# Altium schematic symbol library IC_ADI.SCHLIB: 3169 symbols (part 50 of 181) (continued)
## AD7396ARZ (continued)
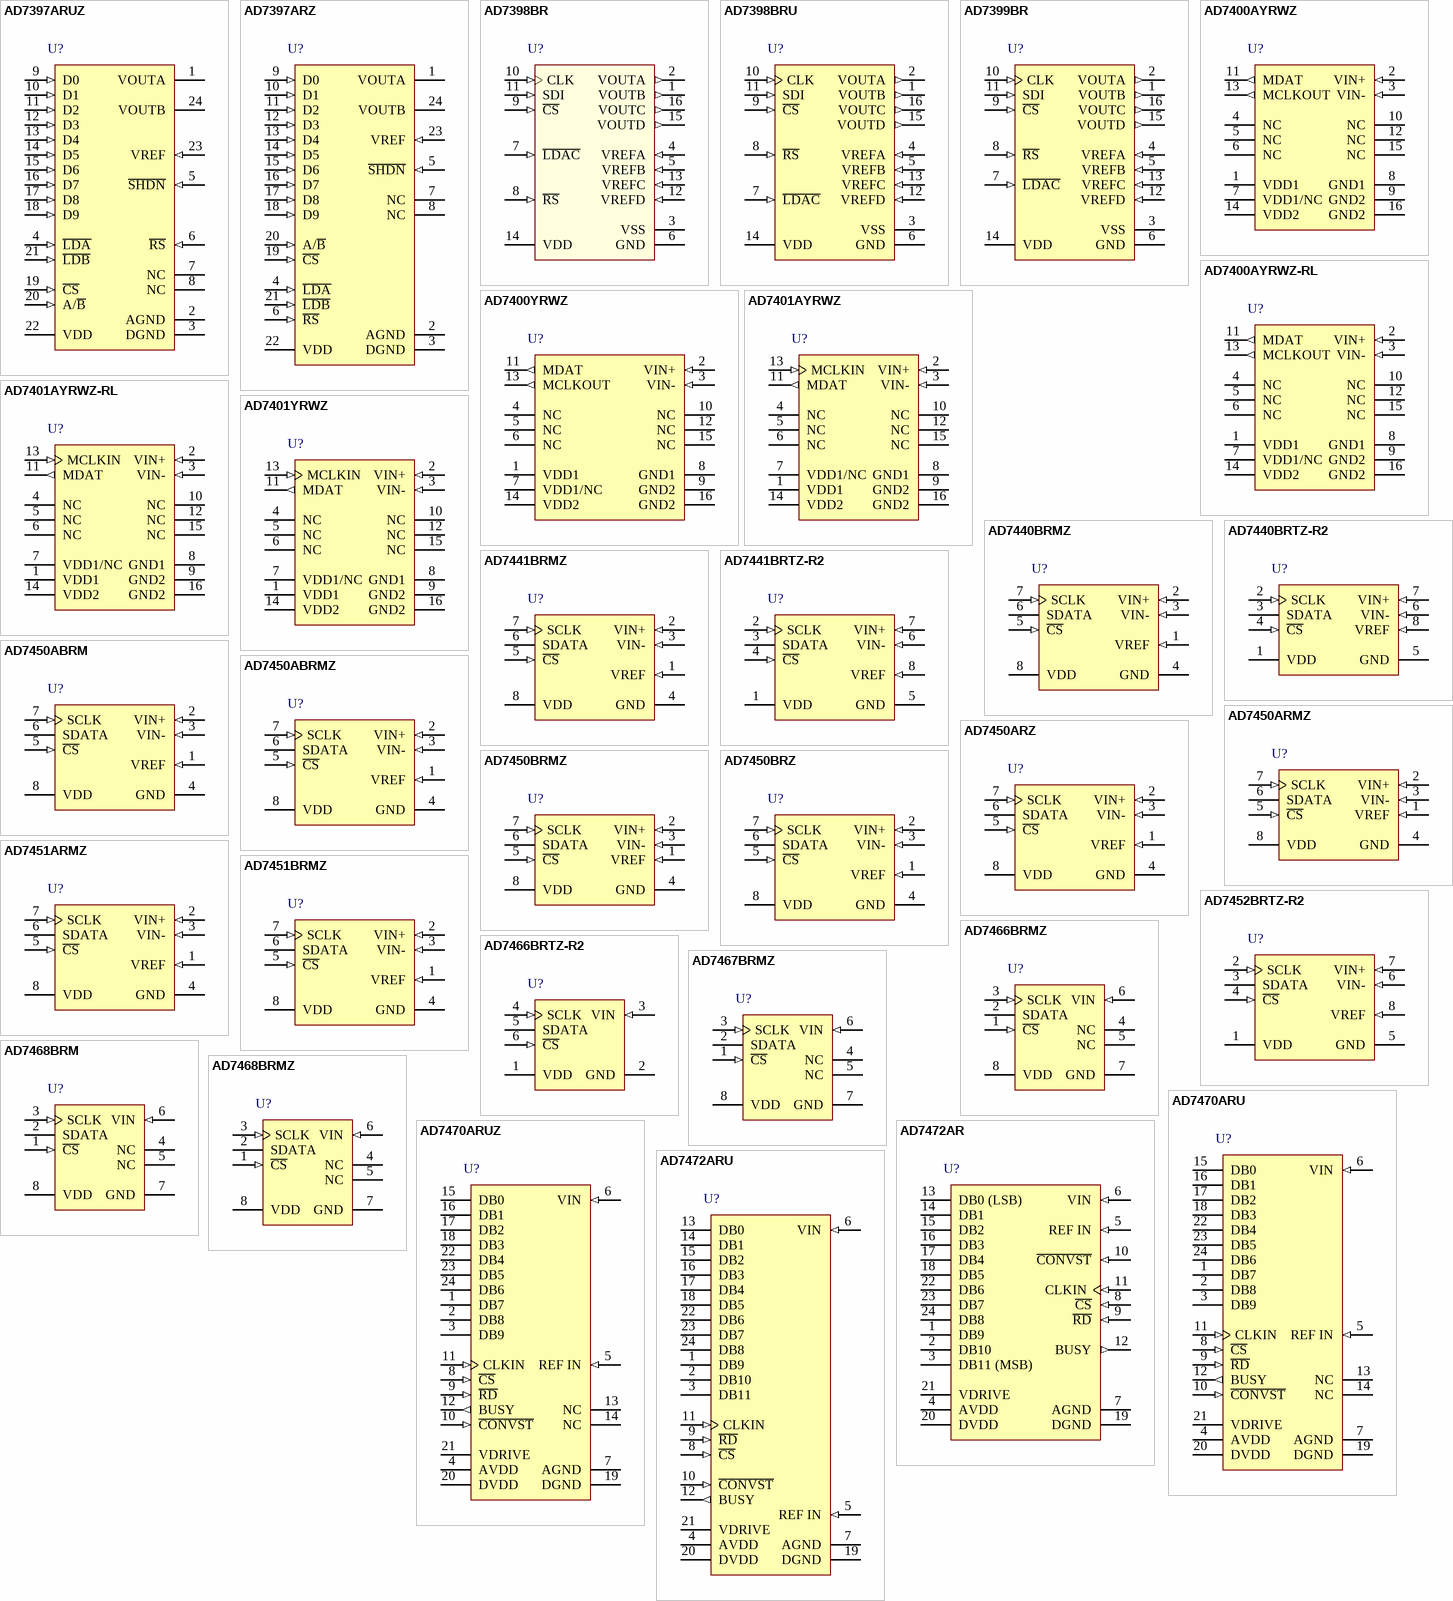
[diagram p43: symbols AD7397ARUZ to AD7472ARU]

## AD7397ARUZ
designator U?
Dual 10-Bit Digital-to-Analog Converter with Parallel Interface, 3 V, -40 to +85 degC, RU-24, Pb-Free, Tube; Generic Part Number: AD7397; PartNumber: AD7397ARUZ; # DAC Outputs: 2; Max V+: 5.5V; Op Pwr Diss: 1mW; Resolution (Bits): 10; Settling Time: 60祍; Single Supply: Yes; DatasheetVersion: Rev.0; PackageVersion: 2002; PackageReference: RU-24; PackageDescription: 24-Lead Thin Shrink Small Outline Package [TSSOP]; Supplier Part Number 1: AD7397ARUZ-ND; Supplier Part Number 2: 584-AD7397ARUZ; Packing: Tube; RoHS: Y; Mounting Technology: Surface Mount; Code_JEDEC: MO-153-AD; ComponentLink1Description: Manufacturer URL; ComponentLink2Description: Datasheet; ComponentLink3Description: Package Specification; ComponentLink4Description: Product URL
footprint TSSOP24_0.65 (Footprint not found)
pins: 1 VOUTA (hiz) "DAC A Voltage Output.", 2 AGND (power) "Analog Ground.", 3 DGND (power) "Digital Ground.", 4 ~{LDA} (in) "Load DAC A Register Strobe. Transfers input register data to the DAC A register. Active low inputs, Level sensitive latch. May be connected together with L\D\B\ to double-buffer load both DAC registers simultaneously.", 5 ~{SHDN} (in) "Power Shutdown Active Low Input. DAC register contents are saved as long as power stays on the VDD pin.", 6 ~{RS} (in) "Resets Input and DAC Register to Zero Condition. Asynchronous active low input.", 7 NC "No Connect", 8 NC "No Connect", 9 D0 (in) "Ten Parallel Input Data Bits.D0 = LSB", 10 D1 (in) "Ten Parallel Input Data Bits.", 11 D2 (in) "Ten Parallel Input Data Bits.", 12 D3 (in) "Ten Parallel Input Data Bits.", 13 D4 (in) "Ten Parallel Input Data Bits.", 14 D5 (in) "Ten Parallel Input Data Bits.", 15 D6 (in) "Ten Parallel Input Data Bits.", 16 D7 (in) "Ten Parallel Input Data Bits.", 17 D8 (in) "Ten Parallel Input Data Bits.", 18 D9 (in) "Ten Parallel Input Data Bits.D9 = MSB", 19 ~{CS} (in) "Chip Select Latch Enable, Active Low.", 20 A/~{B} (in) "DAC Input Register Address Select DACA = 1 or DACB = 0.", 21 ~{LDB} (in) "Load DAC B Register Strobe. Transfers input register data to the DAC B register. Active low inputs, Level sensitive latch. May be connected together with L\D\A\ to double-buffer load both DAC registers simultaneously.", 22 VDD (power) "Positive Power Supply Input. Specified range of operation +2.7 V to +5.5 V.", 23 VREF (in) "DAC Reference Input Pin. Establishes DAC full-scale voltage.", 24 VOUTB (hiz) "DAC B Voltage Output."

## AD7397ARZ
designator U?
Dual 10-Bit Digital-to-Analog Converter with Parallel Interface, 3 V, -40 to +125 degC, RW-24, Pb-Free, Tube; Generic Part Number: AD7397; PartNumber: AD7397ARZ; # DAC Outputs: 2; Max V+: 5.5V; Op Pwr Diss: 1mW; Resolution (Bits): 10; Settling Time: 60祍; Single Supply: Yes; DatasheetVersion: Rev.0; PackageVersion: 060706-A; PackageReference: RW-24; PackageDescription: 24-Lead Standard Small Outline Package [SOIC_W]; Supplier Part Number 1: AD7397ARZ-ND; Supplier Part Number 2: 59K4773; Supplier Part Number 3: 584-AD7397ARZ; Packing: Tube; RoHS: Y; Mounting Technology: Surface Mount; Code_JEDEC: MS-013-AD; ComponentLink1Description: Manufacturer URL; ComponentLink2Description: Datasheet; ComponentLink3Description: Package Specification; ComponentLink4Description: Product URL
footprint SOIC24W_1.27 (Footprint not found)
pins: 1 VOUTA (hiz) "DAC A Voltage Output.", 2 AGND (power) "Analog Ground.", 3 DGND (power) "Digital Ground.", 4 ~{LDA} (in) "Load DAC A Register Strobe. Transfers input register data to the DAC A register. Active low inputs, Level sensitive latch. May be connected together with L\D\B\ to double-buffer load both DAC registers simultaneously.", 5 ~{SHDN} (in) "Power Shutdown Active Low Input. DAC register contents are saved as long as power stays on the VDD pin.", 6 ~{RS} (in) "Resets Input and DAC Register to Zero Condition. Asynchronous active low input.", 7 NC "No Connect", 8 NC "No Connect", 9 D0 (in) "Parallel Input Data Bit,D0 = LSB Pin 9", 10 D1 (in) "Parallel Input Data Bit", 11 D2 (in) "Parallel Input Data Bit", 12 D3 (in) "Parallel Input Data Bit", 13 D4 (in) "Parallel Input Data Bit", 14 D5 (in) "Parallel Input Data Bit", 15 D6 (in) "Parallel Input Data Bit", 16 D7 (in) "Parallel Input Data Bit", 17 D8 (in) "Parallel Input Data Bit", 18 D9 (in) "Parallel Input Data Bit,D9 = MSB Pin 18", 19 ~{CS} (in) "Chip Select Latch Enable, Active Low.", 20 A/~{B} (in) "DAC Input Register Address Select DACA = 1 or DACB = 0.", 21 ~{LDB} (in) "Load DAC B Register Strobe. Transfers input register data to the DAC B register. Active low inputs, Level sensitive latch. May be connected together with L\D\A\ to double-buffer load both DAC registers simultaneously.", 22 VDD (power) "Positive Power Supply Input. Specified range of operation +2.7 V to +5.5 V.", 23 VREF (in) "DAC Reference Input Pin. Establishes DAC full-scale voltage.", 24 VOUTB (hiz) "DAC B Voltage Output."

## AD7398BR
designator U?
Quad 12-Bit Digital-to-Analog Converter with Serial Interface, -40 to +125 degC, RW-16, Tube; Generic Part Number: AD7398; PartNumber: AD7398BR; # DAC Outputs: 4; Max V+: 5.5V; Op Pwr Diss: 27mW; Resolution (Bits): 12; Settling Time: 6祍; Single Supply: Yes; DatasheetVersion: Rev.C; PackageVersion: 032707-B; PackageReference: RW-16; PackageDescription: 16-Lead Standard Small Outline Package [SOIC_W]; Supplier Part Number 1: AD7398BR-ND; Supplier Part Number 2: 584-AD7398BR; Packing: Tube; RoHS: N; Mounting Technology: Surface Mount; Code_JEDEC: MS-013-AA; Code_IPC: SOIC127P1030-16; ComponentLink1Description: Manufacturer URL; ComponentLink2Description: Datasheet; ComponentLink3Description: Package Specification; ComponentLink4Description: Product URL
footprint SOIC16W_1.27 (Footprint not found)
pins: 1 VOUTB (out) "DAC B Voltage Output.", 2 VOUTA (out) "DAC A Voltage Output.", 3 VSS (power) "Negative Power Supply Input. Specified range of operation 0 V to -5.5 V.", 4 VREFA (in) "DAC A Reference Voltage Input Terminal. Establishes DAC A full-scale output voltage. Pin can be tied to VDD pin or VSS pin.", 5 VREFB (in) "DAC B Reference Voltage Input Terminal. Establishes DAC B full-scale output voltage. Pin can be tied to VDD pin or VSS pin.", 6 GND (power) "Ground Pin.", 7 ~{LDAC} (in) "Load DAC Register Strobe. Level sensitive active low. Transfers all input register data to DAC registers.Asynchronous active low input. See Table 5 for operation.", 8 ~{RS} (in) "Resets Input and DAC Registers to All Zero Codes. Shift register contents unchanged.", 9 ~{CS} (in) "Chip Select. Active low input. Disables shift register loading when high. Transfers serial register data to the input register when C\S\ returns high. Does not effect L\D\A\C\ operation.", 10 CLK (in) "Schmitt Triggered Clock Input. Positive edge clocks data into shift register.", 11 SDI (in) "Serial Data Input. Input data loads directly into the shift register.", 12 VREFD (in) "DAC D Reference Voltage Input Terminal. Establishes DAC D full-scale output voltage. Pin can be tied to VDD pin or VSS pin.", 13 VREFC (in) "DAC C Reference Voltage Input Terminal. Establishes DAC C full-scale output voltage. Pin can be tied to VDD pin or VSS pin.", 14 VDD (power) "Positive Power Supply Input. Specified range of operation 3 V to 5 V +/- 10%.", 15 VOUTD (out) "DAC D Voltage Output.", 16 VOUTC (out) "DAC C Voltage Output."

## AD7398BRU
designator U?
Quad 12-Bit Digital-to-Analog Converter with Serial Interface, -40 to +125 degC, RU-16, Tube; Generic Part Number: AD7398; PartNumber: AD7398BRU; # DAC Outputs: 4; Max V+: 5.5V; Op Pwr Diss: 27mW; Resolution (Bits): 12; Settling Time: 6祍; Single Supply: Yes; DatasheetVersion: Rev.C; PackageVersion: Nov-2002; PackageReference: RU-16; PackageDescription: 16-Lead Thin Shrink Small Outline Package [TSSOP]; Supplier Part Number 1: AD7398BRU-ND; Supplier Part Number 2: 584-AD7398BRU; Packing: Tube; RoHS: N; Mounting Technology: Surface Mount; Code_JEDEC: MO-153-AB; ComponentLink1Description: Manufacturer URL; ComponentLink2Description: Datasheet; ComponentLink3Description: Package Specification; ComponentLink4Description: Product URL
footprint TSSOP16_0.65 (Footprint not found)
pins: 1 VOUTB (out) "DAC B Voltage Output.", 2 VOUTA (out) "DAC A Voltage Output.", 3 VSS (power) "Negative Power Supply Input. Specified range of operation 0 V to -5.5 V.", 4 VREFA (in) "DAC A Reference Voltage Input Terminal. Establishes DAC A full-scale output voltage. Pin can be tied to VDD pin or VSS pin.", 5 VREFB (in) "DAC B Reference Voltage Input Terminal. Establishes DAC B full-scale output voltage. Pin can be tied to VDD pin or VSS pin.", 6 GND (power) "Ground Pin.", 7 ~{LDAC} (in) "Load DAC Register Strobe. Level sensitive active low. Transfers all input register data to DAC registers.Asynchronous active low input. See Table 5 for operation.", 8 ~{RS} (in) "Resets Input and DAC Registers to All Zero Codes. Shift register contents unchanged.", 9 ~{CS} (in) "Chip Select. Active low input. Disables shift register loading when high. Transfers serial register data to the input register when C\S\ returns high. Does not effect L\D\A\C\ operation.", 10 CLK (in) "Schmitt Triggered Clock Input. Positive edge clocks data into shift register.", 11 SDI (in) "Serial Data Input. Input data loads directly into the shift register.", 12 VREFD (in) "DAC D Reference Voltage Input Terminal. Establishes DAC D full-scale output voltage. Pin can be tied to VDD pin or VSS pin.", 13 VREFC (in) "DAC C Reference Voltage Input Terminal. Establishes DAC C full-scale output voltage. Pin can be tied to VDD pin or VSS pin.", 14 VDD (power) "Positive Power Supply Input. Specified range of operation 3 V to 5 V +/- 10%.", 15 VOUTD (out) "DAC D Voltage Output.", 16 VOUTC (out) "DAC C Voltage Output."

## AD7399BR
designator U?
Quad 10-Bit Digital-to-Analog Converter with Serial Interface, -40 to +125 degC, RW-16, Tube; Generic Part Number: AD7399; PartNumber: AD7399BR; # DAC Outputs: 4; Max V+: 5.5V; Op Pwr Diss: 27mW; Resolution (Bits): 10; Settling Time: 6祍; Single Supply: Yes; DatasheetVersion: Rev.C; PackageVersion: 032707-B; PackageReference: RW-16; PackageDescription: 16-Lead Standard Small Outline Package [SOIC_W]; Supplier Part Number 1: AD7399BR-ND; Supplier Part Number 2: 584-AD7399BR; Packing: Tube; RoHS: N; Mounting Technology: Surface Mount; Code_JEDEC: MS-013-AA; Code_IPC: SOIC127P1030-16; ComponentLink1Description: Manufacturer URL; ComponentLink2Description: Datasheet; ComponentLink3Description: Package Specification; ComponentLink4Description: Product URL
footprint SOIC16W_1.27 (Footprint not found)
pins: 1 VOUTB (out) "DAC B Voltage Output.", 2 VOUTA (out) "DAC A Voltage Output.", 3 VSS (power) "Negative Power Supply Input. Specified range of operation 0 V to -5.5 V.", 4 VREFA (in) "DAC A Reference Voltage Input Terminal. Establishes DAC A full-scale output voltage. Pin can be tied to VDD pin or VSS pin.", 5 VREFB (in) "DAC B Reference Voltage Input Terminal. Establishes DAC B full-scale output voltage. Pin can be tied to VDD pin or VSS pin.", 6 GND (power) "Ground Pin.", 7 ~{LDAC} (in) "Load DAC Register Strobe. Level sensitive active low. Transfers all input register data to DAC registers.Asynchronous active low input. See Table 5 for operation.", 8 ~{RS} (in) "Resets Input and DAC Registers to All Zero Codes. Shift register contents unchanged.", 9 ~{CS} (in) "Chip Select. Active low input. Disables shift register loading when high. Transfers serial register data to the input register when C\S\ returns high. Does not effect L\D\A\C\ operation.", 10 CLK (in) "Schmitt Triggered Clock Input. Positive edge clocks data into shift register.", 11 SDI (in) "Serial Data Input. Input data loads directly into the shift register.", 12 VREFD (in) "DAC D Reference Voltage Input Terminal. Establishes DAC D full-scale output voltage. Pin can be tied to VDD pin or VSS pin.", 13 VREFC (in) "DAC C Reference Voltage Input Terminal. Establishes DAC C full-scale output voltage. Pin can be tied to VDD pin or VSS pin.", 14 VDD (power) "Positive Power Supply Input. Specified range of operation 3 V to 5 V +/- 10%.", 15 VOUTD (out) "DAC D Voltage Output.", 16 VOUTC (out) "DAC C Voltage Output."

## AD7400AYRWZ
designator U?
Isolated Sigma-Delta Modulator, 10MSPS, -40 to +125 degC, RW-16, Pb-Free, Tube; Generic Part Number: AD7400A; PartNumber: AD7400AYRWZ; Resolution (Bits): 16; Channels: 1; Throughput Rate (SPS): 10M; Interface: Ser; DatasheetVersion: Rev.C; PackageVersion: 032707-B; PackageReference: RW-16; PackageDescription: 16-Lead Standard Small Outline Package [SOIC_W]; Supplier Part Number 1: AD7400AYRWZ-ND; Supplier Part Number 2: 2077695; Supplier Part Number 3: 19P8286; Supplier Part Number 4: 584-AD7400AYRWZ; RoHS: Y; Packing: Tube; Mounting Technology: Surface Mount; Code_JEDEC: MS-013-AA; Code_IPC: SOIC127P1030-16; ComponentLink1Description: Manufacturer URL; ComponentLink2Description: Datasheet; ComponentLink3Description: Package Specification; ComponentLink4Description: Product URL
footprint SOIC16W_1.27 (Footprint not found)
pins: 1 VDD1 (power) "Supply Voltage, 4.5 V to 5.5 V. This is the supply voltage for the isolated side of the AD7400A and is relative to GND1.", 2 VIN+ (in) "Positive Analog Input. Specified range of +/-250 mV.", 3 VIN- (in) "Negative Analog Input. Normally connected to GND1.", 4 NC "No Connect.", 5 NC "No Connect.", 6 NC "No Connect.", 7 VDD1/NC (power) "Supply Voltage. 4.5 V to 5.5 V. This is the supply voltage for the isolated side of the AD7400A and is relative to GND1.No Connect (NC). If desired, Pin 7 of the SOIC device may be allowed to float. It should not be tied to (See Datasheet)", 8 GND1 (power) "Ground 1. This is the ground reference point for all circuitry on the isolated side.", 9 GND2 (power) "Ground 2. This is the ground reference point for all circuitry on the nonisolated side.", 10 NC "No Connect.", 11 MDAT (out) "Serial Data Output. The single bit modulator output is supplied to this pin as a serial data stream. The bits are clocked out on the rising edge of the MCLKOUT output and are valid on the following MCLKOUT rising edge.", 12 NC "No Connect.", 13 MCLKOUT (out) "Master Clock Logic Output (10 MHz Typical). The bit stream from the modulator is valid on the rising edge of MCLKOUT.", 14 VDD2 (power) "Supply Voltage, 3 V to 5.5 V. This is the supply voltage for the nonisolated side and is relative to GND2.", 15 NC "No Connect.", 16 GND2 (power) "Ground 2. This is the ground reference point for all circuitry on the nonisolated side."

## AD7400AYRWZ-RL
designator U?
Isolated Sigma-Delta Modulator, 10MSPS, -40 to +125 degC, RW-16, Pb-Free, Reel; Generic Part Number: AD7400A; PartNumber: AD7400AYRWZ-RL; Resolution (Bits): 16; Channels: 1; Throughput Rate (SPS): 10M; Interface: Ser; DatasheetVersion: Rev.C; PackageVersion: 032707-B; PackageReference: RW-16; PackageDescription: 16-Lead Standard Small Outline Package [SOIC_W]; Supplier Part Number 1: AD7400AYRWZ-RL-ND; Supplier Part Number 2: 584-AD7400AYRWZ-R; RoHS: Y; Packing: Reel; Mounting Technology: Surface Mount; Code_JEDEC: MS-013-AA; Code_IPC: SOIC127P1030-16; ComponentLink1Description: Manufacturer URL; ComponentLink2Description: Datasheet; ComponentLink3Description: Package Specification; ComponentLink4Description: Product URL
footprint SOIC16W_1.27 (Footprint not found)
pins: 1 VDD1 (power) "Supply Voltage, 4.5 V to 5.5 V. This is the supply voltage for the isolated side of the AD7400A and is relative to GND1.", 2 VIN+ (in) "Positive Analog Input. Specified range of +/-250 mV.", 3 VIN- (in) "Negative Analog Input. Normally connected to GND1.", 4 NC "No Connect.", 5 NC "No Connect.", 6 NC "No Connect.", 7 VDD1/NC (power) "Supply Voltage. 4.5 V to 5.5 V. This is the supply voltage for the isolated side of the AD7400A and is relative to GND1.No Connect (NC). If desired, Pin 7 of the SOIC device may be allowed to float. It should not be tied to (See Datasheet)", 8 GND1 (power) "Ground 1. This is the ground reference point for all circuitry on the isolated side.", 9 GND2 (power) "Ground 2. This is the ground reference point for all circuitry on the nonisolated side.", 10 NC "No Connect.", 11 MDAT (out) "Serial Data Output. The single bit modulator output is supplied to this pin as a serial data stream. The bits are clocked out on the rising edge of the MCLKOUT output and are valid on the following MCLKOUT rising edge.", 12 NC "No Connect.", 13 MCLKOUT (out) "Master Clock Logic Output (10 MHz Typical). The bit stream from the modulator is valid on the rising edge of MCLKOUT.", 14 VDD2 (power) "Supply Voltage, 3 V to 5.5 V. This is the supply voltage for the nonisolated side and is relative to GND2.", 15 NC "No Connect.", 16 GND2 (power) "Ground 2. This is the ground reference point for all circuitry on the nonisolated side."

## AD7400YRWZ
designator U?
Isolated Sigma-Delta Modulator, 10MSPS, -40 to +105 degC, RW-16, Pb-Free, Tube; Generic Part Number: AD7400; PartNumber: AD7400YRWZ; Resolution (Bits): 16; Channels: 1; Throughput Rate (SPS): 10M; Interface: Ser; DatasheetVersion: Rev.F; PackageVersion: 032707-B; PackageReference: RW-16; PackageDescription: 16-Lead Standard Small Outline Package [SOIC_W]; Supplier Part Number 1: AD7400YRWZ-ND; Supplier Part Number 2: 1274243; Supplier Part Number 3: 31M4250; Supplier Part Number 4: 19M0866; Supplier Part Number 5: 584-AD7400YRWZ; RoHS: Y; Packing: Tube; Mounting Technology: Surface Mount; Code_JEDEC: MS-013-AA; Code_IPC: SOIC127P1030-16; ComponentLink1Description: Manufacturer URL; ComponentLink2Description: Datasheet; ComponentLink3Description: Package Specification; ComponentLink4Description: Product URL
footprint SOIC16W_1.27 (Footprint not found)
pins: 1 VDD1 (power) "Supply Voltage. 4.5 V to 5.25 V. This is the supply voltage for the isolated side of the AD7400 and is relative to GND1.", 2 VIN+ (in) "Positive Analog Input. Specified range of +/-200 mV.", 3 VIN- (in) "Negative Analog Input. Normally connected to GND1.", 4 NC "No Connect.", 5 NC "No Connect.", 6 NC "No Connect.", 7 VDD1/NC (power) "Supply Voltage. 4.5 V to 5.25 V. This is the supply voltage for the isolated side of the AD7400 and is relative to GND1.", 8 GND1 (power) "Ground 1. This is the ground reference point for all circuitry on the isolated side.", 9 GND2 (power) "Ground 2. This is the ground reference point for all circuitry on the nonisolated side.", 10 NC "No Connect.", 11 MDAT (out) "Serial Data Output. The single bit modulator output is supplied to this pin as a serial data stream.  The bits are clocked out on the rising edge of the MCLKOUT output and valid on the following  MCLKOUT rising edge.", 12 NC "No Connect.", 13 MCLKOUT (out) "Master Clock Logic Output. 10 MHz typical. The bit stream from the modulator is valid on the rising edge  of MCLKOUT.", 14 VDD2 (power) "Supply Voltage. 3 V to 5.5 V. This is the supply voltage for the nonisolated side and is relative to GND2.", 15 NC "No Connect.", 16 GND2 (power) "Ground 2. This is the ground reference point for all circuitry on the nonisolated side."

## AD7401AYRWZ
designator U?
Isolated Sigma-Delta Modulator, 20MSPS, -40 to +125 degC, RW-16, Pb-Free, Tube; Generic Part Number: AD7401A; PartNumber: AD7401AYRWZ; Resolution (Bits): 16; Channels: 1; Throughput Rate (SPS): 20M; Interface: Ser; DatasheetVersion: Rev.C; PackageVersion: 032707-B; PackageReference: RW-16; PackageDescription: 16-Lead Standard Small Outline Package [SOIC_W]; Supplier Part Number 1: AD7401AYRWZ-ND; Supplier Part Number 2: 2074851; Supplier Part Number 3: 07P8950; Supplier Part Number 4: 584-AD7401AYRWZ; RoHS: Y; Packing: Tube; Mounting Technology: Surface Mount; Code_JEDEC: MS-013-AA; Code_IPC: SOIC127P1030-16; ComponentLink1Description: Manufacturer URL; ComponentLink2Description: Datasheet; ComponentLink3Description: Package Specification; ComponentLink4Description: Product URL
footprint SOIC16W_1.27 (Footprint not found)
pins: 1 VDD1 (power) "Supply Voltage, 4.5 V to 5.5 V. This is the supply voltage for the isolated side of the AD7401A and is relative to GND1.", 2 VIN+ (in) "Supply Voltage, 4.5 V to 5.5 V. This is the supply voltage for the isolated side of the AD7401A and is relative to GND1.", 3 VIN- (in) "Negative Analog Input. Normally connected to GND1.", 4 NC "No Connect.", 5 NC "No Connect.", 6 NC "No Connect.", 7 VDD1/NC (power) "Supply Voltage. 4.5 V to 5.5 V. This is the supply voltage for the isolated side of the AD7401A and is relative to GND1.No Connect (NC). If desired, Pin 7 may be allowed to float. It should not be tied to ground. The AD7401A (See Datasheet)", 8 GND1 "Ground 1. This is the ground reference point for all circuitry on the isolated side.", 9 GND2 "Ground 2. This is the ground reference point for all circuitry on the nonisolated side.", 10 NC "No Connect.", 11 MDAT (out) "Serial Data Output. The single bit modulator output is supplied to this pin as a serial data stream. The bits are clocked out on the rising edge of the MCLKIN input and valid on the following MCLKIN rising edge.", 12 NC "No Connect.", 13 MCLKIN (in) "Master Clock Logic Input. 20 MHz maximum. The bit stream from the modulator is valid on the rising edge of MCLKIN.", 14 VDD2 (power) "Supply Voltage. 3 V to 5.5 V. This is the supply voltage for the nonisolated side and is relative to GND2.", 15 NC "No Connect.", 16 GND2 "Ground 2. This is the ground reference point for all circuitry on the nonisolated side."

## AD7401AYRWZ-RL
designator U?
Isolated Sigma-Delta Modulator, 20MSPS, -40 to +125 degC, RW-16, Pb-Free, Reel; Generic Part Number: AD7401A; PartNumber: AD7401AYRWZ-RL; Resolution (Bits): 16; Channels: 1; Throughput Rate (SPS): 20M; Interface: Ser; DatasheetVersion: Rev.C; PackageVersion: 032707-B; PackageReference: RW-16; PackageDescription: 16-Lead Standard Small Outline Package [SOIC_W]; Supplier Part Number 1: AD7401AYRWZ-RLTR-ND; Supplier Part Number 2: AD7401AYRWZ-RLCT-ND; Supplier Part Number 3: AD7401AYRWZ-RLDKR-ND; Supplier Part Number 4: 584-AD7401AYRWZ-R; RoHS: Y; Packing: Reel; Mounting Technology: Surface Mount; Code_JEDEC: MS-013-AA; Code_IPC: SOIC127P1030-16; ComponentLink1Description: Manufacturer URL; ComponentLink2Description: Datasheet; ComponentLink3Description: Package Specification; ComponentLink4Description: Product URL
footprint SOIC16W_1.27 (Footprint not found)
pins: 1 VDD1 (power) "Supply Voltage, 4.5 V to 5.5 V. This is the supply voltage for the isolated side of the AD7401A and is relative to GND1.", 2 VIN+ (in) "Supply Voltage, 4.5 V to 5.5 V. This is the supply voltage for the isolated side of the AD7401A and is relative to GND1.", 3 VIN- (in) "Negative Analog Input. Normally connected to GND1.", 4 NC "No Connect.", 5 NC "No Connect.", 6 NC "No Connect.", 7 VDD1/NC (power) "Supply Voltage. 4.5 V to 5.5 V. This is the supply voltage for the isolated side of the AD7401A and is relative to GND1.No Connect (NC). If desired, Pin 7 may be allowed to float. It should not be tied to ground. The AD7401A (See Datasheet)", 8 GND1 "Ground 1. This is the ground reference point for all circuitry on the isolated side.", 9 GND2 "Ground 2. This is the ground reference point for all circuitry on the nonisolated side.", 10 NC "No Connect.", 11 MDAT (out) "Serial Data Output. The single bit modulator output is supplied to this pin as a serial data stream. The bits are clocked out on the rising edge of the MCLKIN input and valid on the following MCLKIN rising edge.", 12 NC "No Connect.", 13 MCLKIN (in) "Master Clock Logic Input. 20 MHz maximum. The bit stream from the modulator is valid on the rising edge of MCLKIN.", 14 VDD2 (power) "Supply Voltage. 3 V to 5.5 V. This is the supply voltage for the nonisolated side and is relative to GND2.", 15 NC "No Connect.", 16 GND2 "Ground 2. This is the ground reference point for all circuitry on the nonisolated side."

## AD7401YRWZ
designator U?
Isolated Sigma-Delta Modulator, 20MSPS, -40 to +105 degC, RW-16, Pb-Free, Tube; Generic Part Number: AD7401; PartNumber: AD7401YRWZ; Resolution (Bits): 16; Channels: 1; Throughput Rate (SPS): 20M; Interface: Ser; DatasheetVersion: Rev.D; PackageVersion: 032707-B; PackageReference: RW-16; PackageDescription: 16-Lead Standard Small Outline Package [SOIC_W]; Supplier Part Number 1: AD7401YRWZ-ND; Supplier Part Number 2: 1274242; Supplier Part Number 3: 31M4251; Supplier Part Number 4: 19M0867; Supplier Part Number 5: 584-AD7401YRWZ; RoHS: Y; Packing: Tube; Mounting Technology: Surface Mount; Code_JEDEC: MS-013-AA; Code_IPC: SOIC127P1030-16; ComponentLink1Description: Manufacturer URL; ComponentLink2Description: Datasheet; ComponentLink3Description: Package Specification; ComponentLink4Description: Product URL
footprint SOIC16W_1.27 (Footprint not found)
pins: 1 VDD1 (power) "Supply Voltage. 4.5 V to 5.25 V. This is the supply voltage for the isolated side of the AD7401 and is relative to GND1.", 2 VIN+ (in) "Positive Analog Input. Specified range of +/-200 mV.", 3 VIN- (in) "Negative Analog Input. Normally connected to GND1.", 4 NC "No Connect.", 5 NC "No Connect.", 6 NC "No Connect.", 7 VDD1/NC (power) "Supply Voltage. 4.5 V to 5.25 V. This is the supply voltage for the isolated side of the AD7401 and is relative to GND1. No Connect (NC). If desired, Pin 7 may be allowed to float. It should not be tied to ground. The AD7401 (See Datasheet)", 8 GND1 (power) "Ground 1. This is the ground reference point for all circuitry on the isolated side.", 9 GND2 (power) "Ground 2. This is the ground reference point for all circuitry on the nonisolated side.", 10 NC "No Connect.", 11 MDAT (out) "Serial Data Output. The single bit modulator output is supplied to this pin as a serial data stream. The bits are clocked out on the rising edge of the MCLKIN input and valid on the following MCLKIN rising edge.", 12 NC "No Connect.", 13 MCLKIN (in) "Master Clock Logic Input. 20 MHz maximum. The bit stream from the modulator is valid on the rising edge of MCLKIN.", 14 VDD2 (power) "Supply Voltage. 3 V to 5.5 V. This is the supply voltage for the nonisolated side and is relative to GND2.", 15 NC "No Connect.", 16 GND2 (power) "Ground 2. This is the ground reference point for all circuitry on the nonisolated side."

## AD7440BRMZ
designator U?
Single 10-Bit Analog-to-Digital Converter with Serial, SPI Interface, 1MSPS, -40 to +85 degC, RM-8, Pb-Free, Tube; Generic Part Number: AD7440; PartNumber: AD7440BRMZ; Resolution (Bits): 10; Channels: 1; Throughput Rate (SPS): 1M; Interface: Ser, SPI; DatasheetVersion: Rev.C; PackageVersion: Aug-2005; PackageReference: RM-8; PackageDescription: 8-Lead Mini Small Outline Package [MSOP]; Supplier Part Number 1: AD7440BRMZ-ND; Supplier Part Number 2: 1438841; Supplier Part Number 3: 584-AD7440BRMZ; RoHS: Y; Packing: Tube; Mounting Technology: Surface Mount; Code_JEDEC: MO-187-AA; ComponentLink1Description: Manufacturer URL; ComponentLink2Description: Datasheet; ComponentLink3Description: Package Specification; ComponentLink4Description: Product URL
footprint VSSOP8_0.65 (Footprint not found)
pins: 1 VREF (in) "Reference Input for the AD7440. An external reference must be applied to this input. For a 5 V power supply, the reference is 2.5 V (+/-1%) for specified performance. For a 3 V power supply, the reference is 2 V (+/-1%) for (See Datasheet)", 2 VIN+ (in) "Positive Terminal for Differential Analog Input.", 3 VIN- (in) "Negative Terminal for Differential Analog Input.", 4 GND (power) "Analog Ground. Ground reference point for all circuitry on the AD7440. All analog input signals and any external reference signal should be referred to this GND voltage.", 5 ~{CS} (in) "Chip Select. Active low logic input. This input provides the dual function of initiating a conversion on the AD7440 and framing the serial data transfer.", 6 SDATA (hiz) "Serial Data. Logic output. The conversion result from the AD7440 is provided on this output as a serial data stream. The bits are clocked out on the falling edge of the SCLK input. The data stream of the AD7450A consists of (See Datasheet)", 7 SCLK (in) "Serial Clock. Logic input. SCLK provides the serial clock for accessing data from the part. This clock input is also used as the clock source for the conversion process.", 8 VDD (power) "Power Supply Input. VDD is 3 V (+20%/-10%) or 5 V (+/-5%). This supply should be decoupled to GND with a 0.1 uF capacitor and a 10 uF tantalum capacitor in parallel."

## AD7440BRTZ-R2
designator U?
Single 10-Bit Analog-to-Digital Converter with Serial, SPI Interface, 1MSPS, -40 to +85 degC, RJ-8, Pb-Free, Reel; Generic Part Number: AD7440; PartNumber: AD7440BRTZ-R2; Resolution (Bits): 10; Channels: 1; Throughput Rate (SPS): 1M; Interface: Ser, SPI; DatasheetVersion: Rev.C; PackageVersion: 121608-A; PackageReference: RJ-8; PackageDescription: 8-Lead Thin Small Outline Transistor Package [SOT-23]; Supplier Part Number 1: AD7440BRTZ-R2TR-ND; Supplier Part Number 2: AD7440BRTZ-R2CT-ND; Supplier Part Number 3: AD7440BRTZ-R2DKR-ND; Supplier Part Number 4: 584-AD7440BRTZ-R2; RoHS: Y; Packing: Reel; Mounting Technology: Surface Mount; Code_JEDEC: MO-178-BA; ComponentLink1Description: Manufacturer URL; ComponentLink2Description: Datasheet; ComponentLink3Description: Package Specification; ComponentLink4Description: Product URL
footprint SOT23-8 (Footprint not found)
pins: 1 VDD (power) "Power Supply Input. VDD is 3 V (+20%/-10%) or 5 V (+/-5%). This supply should be decoupled to GND with a 0.1 uF capacitor and a 10 uF tantalum capacitor in parallel.", 2 SCLK (in) "Serial Clock. Logic input. SCLK provides the serial clock for accessing data from the part. This clock input is also used as the clock source for the conversion process.", 3 SDATA (hiz) "Serial Data. Logic output. The conversion result from the AD7440/AD7450A is provided on this output as a serial data stream. The bits are clocked out on the falling edge of the SCLK input. The data stream of the AD7450A (See Datasheet)", 4 ~{CS} (in) "Chip Select. Active low logic input. This input provides the dual function of initiating a conversion on the AD7440/AD7450A and framing the serial data transfer.", 5 GND (power) "Analog Ground. Ground reference point for all circuitry on the AD7440/AD7450A. All analog input signals and any external reference signal should be referred to this GND voltage.", 6 VIN- (in) "Negative Terminal for Differential Analog Input.", 7 VIN+ (in) "Positive Terminal for Differential Analog Input.", 8 VREF (in) "Reference Input for the AD7440/AD7450A. An external reference must be applied to this input. For a 5 V power supply, the reference is 2.5 V (+/-1%) for specified performance. For a 3 V power supply, the reference is 2 V (See Datasheet)"

## AD7441BRMZ
designator U?
Single 10-Bit Analog-to-Digital Converter with Serial, SPI Interface, 1MSPS, -40 to +85 degC, RM-8, Pb-Free, Tube; Generic Part Number: AD7441; PartNumber: AD7441BRMZ; Resolution (Bits): 10; Channels: 1; Throughput Rate (SPS): 1M; Interface: Ser, SPI; DatasheetVersion: Rev.D; PackageVersion: Aug-2005; PackageReference: RM-8; PackageDescription: 8-Lead Mini Small Outline Package [MSOP]; Supplier Part Number 1: AD7441BRMZ-ND; Supplier Part Number 2: 59K4818; Supplier Part Number 3: 584-AD7441BRMZ; RoHS: Y; Packing: Tube; Mounting Technology: Surface Mount; Code_JEDEC: MO-187-AA; ComponentLink1Description: Manufacturer URL; ComponentLink2Description: Datasheet; ComponentLink3Description: Package Specification; ComponentLink4Description: Product URL
footprint VSSOP8_0.65 (Footprint not found)
pins: 1 VREF (in) "Reference Input for the AD7441/AD7451. An external reference in the range of 100 mV to VDD must be applied to this input. The specified reference input is 2.5 V. This pin is decoupled to GND with a capacitor of at least 0.1 (See Datasheet)", 2 VIN+ (in) "Noninverting Analog Input.", 3 VIN- (in) "Inverting Input. This pin sets the ground reference point for the VIN+ input. Connect to ground or to a dc offset to provide a pseudo ground.", 4 GND (power) "Analog Ground. Ground reference point for all circuitry on the AD7441/AD7451. All analog input signals and any external reference signal are referred to this GND voltage.", 5 ~{CS} (in) "Chip Select. Active low logic input. This input provides the dual function of initiating a conversion on the AD7441/AD7451 and framing the serial data transfer.", 6 SDATA (hiz) "Serial Data, Logic Output. The conversion result from the AD7441/AD7451 is provided on this output as a serial data stream. The bits are clocked out on the falling edge of the SCLK input. The data stream of the AD7451 (See Datasheet)", 7 SCLK (in) "Serial Clock, Logic Input. SCLK provides the serial clock for accessing data from the part. This clock input is also used as the clock source for the conversion process.", 8 VDD (power) "Power Supply Input. VDD is 2.7 V to 5.25 V. This supply is decoupled to GND with a 0.1 uF capacitor and a 10 uF tantalum capacitor."

## AD7441BRTZ-R2
designator U?
Single 10-Bit Analog-to-Digital Converter with Serial, SPI Interface, 1MSPS, -40 to +85 degC, RJ-8, Pb-Free, Reel; Generic Part Number: AD7441; PartNumber: AD7441BRTZ-R2; Resolution (Bits): 10; Channels: 1; Throughput Rate (SPS): 1M; Interface: Ser, SPI; DatasheetVersion: Rev.D; PackageVersion: 121608-A; PackageReference: RJ-8; PackageDescription: 8-Lead Thin Small Outline Transistor Package [SOT-23]; Supplier Part Number 1: N/A; RoHS: Y; Packing: Reel; Mounting Technology: Surface Mount; Code_JEDEC: MO-178-BA; ComponentLink1Description: Manufacturer URL; ComponentLink2Description: Datasheet; ComponentLink3Description: Package Specification; ComponentLink4Description: Product URL
footprint SOT23-8 (Footprint not found)
pins: 1 VDD (power) "Power Supply Input. VDD is 2.7 V to 5.25 V. This supply is decoupled to GND with a 0.1 uF capacitor and a 10 uF tantalum capacitor.", 2 SCLK (in) "Serial Clock, Logic Input. SCLK provides the serial clock for accessing data from the part. This clock input is also used as the clock source for the conversion process.", 3 SDATA (hiz) "Serial Data, Logic Output. The conversion result from the AD7441/AD7451 is provided on this output as a serial data stream. The bits are clocked out on the falling edge of the SCLK input. The data stream of the AD7451 (See Datasheet)", 4 ~{CS} (in) "Chip Select. Active low logic input. This input provides the dual function of initiating a conversion on the AD7441/AD7451 and framing the serial data transfer.", 5 GND (power) "Analog Ground. Ground reference point for all circuitry on the AD7441/AD7451. All analog input signals and any external reference signal are referred to this GND voltage.", 6 VIN- (in) "Inverting Input. This pin sets the ground reference point for the VIN+ input. Connect to ground or to a dc offset to provide a pseudo ground.", 7 VIN+ (in) "Noninverting Analog Input.", 8 VREF (in) "Reference Input for the AD7441/AD7451. An external reference in the range of 100 mV to VDD must be applied to this input. The specified reference input is 2.5 V. This pin is decoupled to GND with a capacitor of at least 0.1 (See Datasheet)"